# Altium footprint library Resistors.PcbLib: 63 footprints (part 1 of 4)
Each footprint in its own frame and in the unit in brackets; x right, y up, seen from the top. Pads: shape width x height; smd on the part's side, far side on the other; paste and mask are expansions set on the pad; w line width, h text height; cw(c..) or ccw(c..) is an arc to the next point about the centre after c.
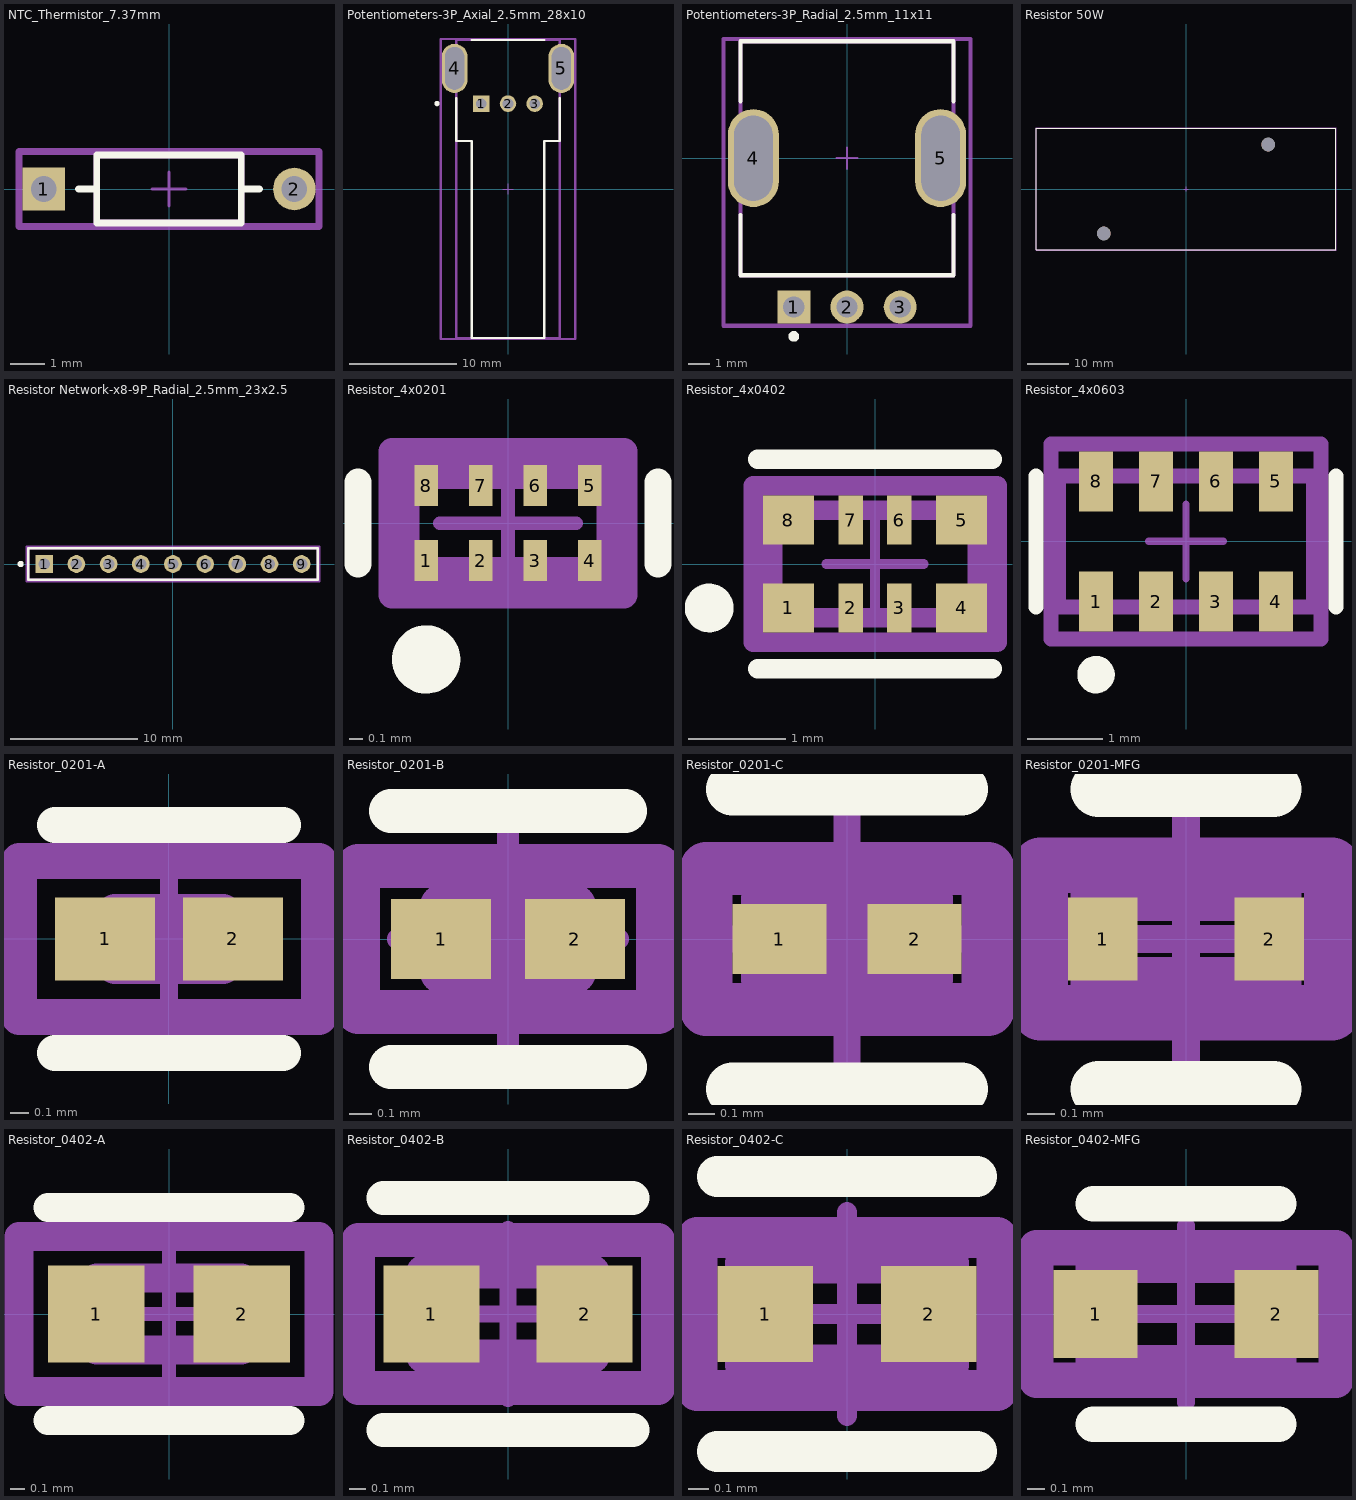
[diagram p0: the footprints below, top view; thin cyan lines are the x and y axes]

## NTC_Thermistor_7.37mm [mm]
pads (2):
  rect 1.25x1.25 hole 0.75 paste-2539.97 mask+0: 1(-3.685,0)
  round 1.25 hole 0.75 paste-2539.97 mask+0: 2(3.685,0)
Top Overlay:
  lines w0.2: -2.66,0 -2.125,0 ; 2.125,0 2.66,0 ; -2.125,-1 2.125,-1 2.125,1 -2.125,1 -2.125,-1
Top Assembly:
  lines w0.2: -4.41,-1.1 4.41,-1.1 4.41,1.1 -4.41,1.1 -4.41,-1.1
Top 3D Body:
  lines w0.2: -2.125,-1 2.125,-1 2.125,1 -2.125,1 -2.125,-1
Top Courtyard:
  lines w0.2: -4.41,-1.1 4.41,-1.1 4.41,1.1 -4.41,1.1 -4.41,-1.1
Top Component Center:
  lines w0.1: -0.5,0 0.5,0 ; 0,-0.5 0,0.5
3D body "Res_Vishay_BC_Components_NTCLG100E2224JB_eec.STEP": height 0.25, standoff 0, extent -4.41,-1.1 4.41,1.1

## Potentiometers-3P_Axial_2.5mm_28x10 [mm]
pads (5):
  rect 1.55x1.55 hole 1 paste-2539.97 mask+0: 1(-2.5,8)
  round 1.55 hole 1 paste-2539.97 mask+0: 2(0,8) 3(2.5,8)
  rrect100% 2.4x4.6 hole 4 slot 1.8 at 0 deg paste-2539.97 mask+0: 4(-5,11.3) 5(5,11.3)
Top Overlay:
  circle w0.25: c-6.65,8 r0.125
  lines w0.2: -4.85,8.5 -4.85,4.5 -3.4,4.5 -3.4,-13.95 3.4,-13.95 3.4,4.5 4.85,4.5 4.85,8.5 ; -3.425,13.95 3.425,13.95
Top Assembly:
  lines w0.2: -6.3,-14.05 -6.3,14.05 6.3,14.05 6.3,-14.05 -6.3,-14.05
Top 3D Body:
  lines w0.2: -4.85,-13.95 -4.85,13.95 4.85,13.95 4.85,-13.95 -4.85,-13.95
Top Courtyard:
  lines w0.2: -6.3,-14.05 -6.3,14.05 6.3,14.05 6.3,-14.05 -6.3,-14.05
Top Component Center:
  lines w0.1: -0.5,0 0.5,0 ; 0,-0.5 0,0.5
3D body "Res_Bourns_PTV09A-8025U-B103_eec.STEP": height 0.25, standoff 0, extent -6.3,-14.05 6.3,14.05

## Potentiometers-3P_Radial_2.5mm_11x11 [mm]
pads (5):
  rect 1.55x1.55 hole 1 paste-2539.97 mask+0: 1(-2.5,-7)
  round 1.55 hole 1 paste-2539.97 mask+0: 2(0,-7) 3(2.5,-7)
  rrect100% 2.4x4.6 hole 4 slot 1.8 at 0 deg paste-2539.97 mask+0: 4(-4.4,0) 5(4.4,0)
Top Overlay:
  circle w0.25: c-2.5,-8.375 r0.125
  lines w0.2: -5,-2.675 -5,-5.5 5,-5.5 5,-2.675 ; -5,2.675 -5,5.5 5,5.5 5,2.675
Top Assembly:
  lines w0.2: -5.8,-7.875 -5.8,5.6 5.8,5.6 5.8,-7.875 -5.8,-7.875
Top 3D Body:
  lines w0.2: -5,-5.5 -5,5.5 5,5.5 5,-5.5 -5,-5.5
Top Courtyard:
  lines w0.2: -5.8,-7.875 -5.8,5.6 5.8,5.6 5.8,-7.875 -5.8,-7.875
Top Component Center:
  lines w0.1: -0.5,0 0.5,0 ; 0,-0.5 0,0.5
3D body "Res_Bourns_Inc_PTV09A-4020F-A203_eec.STEP": height 0.25, standoff 0, extent -5.8,-7.875 5.8,5.6

## Resistor 50W [mm]
pads (2):
  round 3.307 hole 3.307 unplated paste-2539.97 mask+0: ""(-19.835,-10.72) ""(19.835,10.72)
Top Overlay:
  lines w0.2: -36.105,-14.67 36.105,-14.67 36.105,14.67 -36.105,14.67 -36.105,-14.67
Top Assembly:
  lines w0.2: -36.205,-14.77 36.205,-14.77 36.205,14.77 -36.205,14.77 -36.205,-14.77
Top 3D Body:
  lines w0.2: -36.105,-14.67 36.105,-14.67 36.105,14.67 -36.105,14.67 -36.105,-14.67
Top Courtyard:
  lines w0.2: -36.205,-14.77 36.205,-14.77 36.205,14.77 -36.205,14.77 -36.205,-14.77
Top Component Center:
  lines w0.1: -0.5,0 0.5,0 ; 0,-0.5 0,0.5
3D body "Res_vishay_RH05020R00FE02_eec.STEP": height 0.25, standoff 0, extent -36.205,-14.77 36.205,14.77

## Resistor Network-x8-9P_Radial_2.5mm_23x2.5 [mm]
pads (9):
  rect 1.4x1.4 hole 0.9 paste-2539.97 mask+0: 1(-10.16,0)
  round 1.4 hole 0.9 paste-2539.97 mask+0: 2(-7.62,0) 3(-5.08,0) 4(-2.54,0) 5(0,0) 6(2.54,0) 7(5.08,0) 8(7.62,0) 9(10.16,0)
Top Overlay:
  circle w0.25: c-12.03,0 r0.125
  lines w0.2: -11.43,-1.25 11.43,-1.25 11.43,1.25 -11.43,1.25 -11.43,-1.25
Top Assembly:
  lines w0.2: -11.53,-1.35 11.53,-1.35 11.53,1.35 -11.53,1.35 -11.53,-1.35
Top 3D Body:
  lines w0.2: -11.43,-1.25 11.43,-1.25 11.43,1.25 -11.43,1.25 -11.43,-1.25
Top Courtyard:
  lines w0.2: -11.53,-1.35 11.53,-1.35 11.53,1.35 -11.53,1.35 -11.53,-1.35
Top Component Center:
  lines w0.1: -0.5,0 0.5,0 ; 0,-0.5 0,0.5
3D body "Res_International_Resistive_L091S222LF_eec.STEP": height 0.25, standoff 0, extent -11.53,-1.35 11.53,1.35

## Resistor_4x0201 [mm]
pads (8):
  rect 0.175x0.3 smd paste+0 mask+0: 1(-0.6,-0.275) 2(-0.2,-0.275) 3(0.2,-0.275) 4(0.6,-0.275) 5(0.6,0.275) 6(0.2,0.275) 7(-0.2,0.275) 8(-0.6,0.275)
Top Overlay:
  circle w0.25: c-0.6,-1 r0.125
  lines w0.2: -1.1,-0.3 -1.1,0.3 ; 1.1,-0.3 1.1,0.3
Top Assembly:
  lines w0.2: -0.85,-0.525 0.85,-0.525 0.85,0.525 -0.85,0.525 -0.85,-0.525
Top 3D Body:
  lines w0.2: -0.75,-0.35 0.75,-0.35 0.75,0.35 -0.75,0.35 -0.75,-0.35
Top Courtyard:
  lines w0.2: -0.85,-0.525 0.85,-0.525 0.85,0.525 -0.85,0.525 -0.85,-0.525
Top Component Center:
  lines w0.1: -0.5,0 0.5,0 ; 0,-0.5 0,0.5
3D body "Res_Panasonic_EXB-18V472JX_eec.STEP": height 0.25, standoff 0, extent -0.85,-0.525 0.85,0.525

## Resistor_4x0402 [mm]
pads (8):
  rect 0.525x0.5 smd paste+0 mask+0: 1(-0.887,-0.45) 4(0.887,-0.45) 5(0.887,0.45) 8(-0.887,0.45)
  rect 0.25x0.5 smd paste+0 mask+0: 2(-0.25,-0.45) 3(0.25,-0.45) 6(0.25,0.45) 7(-0.25,0.45)
Top Overlay:
  circle w0.25: c-1.7,-0.45 r0.125
  lines w0.2: -1.2,-1.075 1.2,-1.075 ; -1.2,1.075 1.2,1.075
Top Assembly:
  lines w0.2: -1.25,-0.8 1.25,-0.8 1.25,0.8 -1.25,0.8 -1.25,-0.8
Top 3D Body:
  lines w0.2: -1.05,-0.55 1.05,-0.55 1.05,0.55 -1.05,0.55 -1.05,-0.55
Top Courtyard:
  lines w0.2: -1.25,-0.8 1.25,-0.8 1.25,0.8 -1.25,0.8 -1.25,-0.8
Top Component Center:
  lines w0.1: -0.5,0 0.5,0 ; 0,-0.5 0,0.5
3D body "Res_Panasonic_EXB-28V103JX_eec.STEP": height 0.25, standoff 0, extent -1.25,-0.8 1.25,0.8

## Resistor_4x0603 [mm]
pads (8):
  rect 0.45x0.8 smd paste+0 mask+0: 1(-1.2,-0.8) 2(-0.4,-0.8) 3(0.4,-0.8) 4(1.2,-0.8) 5(1.2,0.8) 6(0.4,0.8) 7(-0.4,0.8) 8(-1.2,0.8)
Top Overlay:
  circle w0.25: c-1.2,-1.775 r0.125
  lines w0.2: -2,-0.875 -2,0.875 ; 2,-0.875 2,0.875
Top Assembly:
  lines w0.2: -1.8,-1.3 1.8,-1.3 1.8,1.3 -1.8,1.3 -1.8,-1.3
Top 3D Body:
  lines w0.2: -1.7,-0.875 1.7,-0.875 1.7,0.875 -1.7,0.875 -1.7,-0.875
Top Courtyard:
  lines w0.2: -1.8,-1.3 1.8,-1.3 1.8,1.3 -1.8,1.3 -1.8,-1.3
Top Component Center:
  lines w0.1: -0.5,0 0.5,0 ; 0,-0.5 0,0.5
3D body "Res_Panasonic_EXB-38V103JV_eec.STEP": height 0.25, standoff 0, extent -1.8,-1.3 1.8,1.3

## Resistor_0201-A [mm]
pads (2):
  rect 0.554x0.463 smd paste+0 mask+0: 1(-0.354,0) 2(0.354,0)
Top Overlay:
  lines w0.2: -0.631,-0.631 0.631,-0.631 ; -0.631,0.631 0.631,0.631
Top Assembly:
  lines w0.2: -0.831,-0.431 0.831,-0.431 0.831,0.431 -0.831,0.431 -0.831,-0.431
Top 3D Body:
  lines w0.2: -0.3,-0.15 0.3,-0.15 0.3,0.15 -0.3,0.15 -0.3,-0.15
Top Courtyard:
  lines w0.2: -0.831,-0.431 0.831,-0.431 0.831,0.431 -0.831,0.431 -0.831,-0.431
Top Component Center:
  lines w0.1: -0.5,0 0.5,0 -0.5,0 ; 0,-0.5 0,0.5 0,-0.5
3D body "Res_Panasonic_Electronic_Components_ERJ-1GNF4872C_eec.STEP": height 0.25, standoff 0, extent -0.831,-0.431 0.831,0.431

## Resistor_0201-B [mm]
pads (2):
  rect 0.454x0.363 smd paste+0 mask+0: 1(-0.304,0) 2(0.304,0)
Top Overlay:
  lines w0.2: -0.531,-0.581 0.531,-0.581 ; -0.531,0.581 0.531,0.581
Top Assembly:
  lines w0.2: -0.681,-0.331 0.681,-0.331 0.681,0.331 -0.681,0.331 -0.681,-0.331
Top 3D Body:
  lines w0.2: -0.3,-0.15 0.3,-0.15 0.3,0.15 -0.3,0.15 -0.3,-0.15
Top Courtyard:
  lines w0.2: -0.681,-0.331 0.681,-0.331 0.681,0.331 -0.681,0.331 -0.681,-0.331
Top Component Center:
  lines w0.1: -0.5,0 0.5,0 -0.5,0 ; 0,-0.5 0,0.5 0,-0.5
3D body "Res_Panasonic_Electronic_Components_ERJ-1GNF4872C_eec.STEP": height 0.25, standoff 0, extent -0.681,-0.331 0.681,0.331

## Resistor_0201-C [mm]
pads (2):
  rect 0.354x0.263 smd paste+0 mask+0: 1(-0.254,0) 2(0.254,0)
Top Overlay:
  lines w0.2: -0.431,-0.565 0.431,-0.565 ; -0.431,0.565 0.431,0.565
Top Assembly:
  lines w0.2: -0.531,-0.265 -0.531,0.265 0.531,0.265 0.531,-0.265 -0.531,-0.265
Top 3D Body:
  lines w0.2: -0.3,-0.15 -0.3,0.15 0.3,0.15 0.3,-0.15 -0.3,-0.15
Top Courtyard:
  lines w0.2: -0.531,-0.265 -0.531,0.265 0.531,0.265 0.531,-0.265 -0.531,-0.265
Top Component Center:
  lines w0.1: -0.5,0 0.5,0 -0.5,0 ; 0,-0.5 0,0.5 0,-0.5
3D body "Res_Panasonic_Electronic_Components_ERJ-1GNF4872C_eec.STEP": height 0.25, standoff 0, extent -0.531,-0.265 0.531,0.265

## Resistor_0201-MFG [mm]
pads (2):
  rect 0.25x0.3 smd paste+0 mask+0: 1(-0.3,0) 2(0.3,0)
Top Overlay:
  lines w0.2: -0.315,-0.54 0.315,-0.54 ; -0.315,0.54 0.315,0.54
Top Assembly:
  lines w0.2: -0.525,-0.265 -0.525,0.265 0.525,0.265 0.525,-0.265 -0.525,-0.265
Top 3D Body:
  lines w0.2: -0.315,-0.165 -0.315,0.165 0.315,0.165 0.315,-0.165 -0.315,-0.165
Top Courtyard:
  lines w0.2: -0.525,-0.265 -0.525,0.265 0.525,0.265 0.525,-0.265 -0.525,-0.265
Top Component Center:
  lines w0.1: -0.5,0 0.5,0 ; 0,-0.5 0,0.5
3D body "Res_Panasonic_Electronic_Components_ERJ-1GNF4872C_eec.STEP": height 0.25, standoff 0, extent -0.525,-0.265 0.525,0.265

## Resistor_0402-A [mm]
pads (2):
  rect 0.668x0.672 smd paste+0 mask+0: 1(-0.502,0) 2(0.502,0)
Top Overlay:
  lines w0.2: -0.836,-0.736 0.836,-0.736 ; -0.836,0.736 0.836,0.736
Top Assembly:
  lines w0.2: -1.036,-0.536 1.036,-0.536 1.036,0.536 -1.036,0.536 -1.036,-0.536
Top 3D Body:
  lines w0.2: -0.5,-0.25 0.5,-0.25 0.5,0.25 -0.5,0.25 -0.5,-0.25
Top Courtyard:
  lines w0.2: -1.036,-0.536 1.036,-0.536 1.036,0.536 -1.036,0.536 -1.036,-0.536
Top Component Center:
  lines w0.1: -0.5,0 0.5,0 ; 0,-0.5 0,0.5
3D body "Res_Panasonic_ERJ-2RKF10R0X_eec.STEP": height 0.25, standoff 0, extent -1.036,-0.536 1.036,0.536

## Resistor_0402-B [mm]
pads (2):
  rect 0.568x0.572 smd paste+0 mask+0: 1(-0.452,0) 2(0.452,0)
Top Overlay:
  lines w0.2: -0.736,-0.686 0.736,-0.686 ; -0.736,0.686 0.736,0.686
Top Assembly:
  lines w0.2: -0.886,-0.436 -0.886,0.436 0.886,0.436 0.886,-0.436 -0.886,-0.436
Top 3D Body:
  lines w0.2: -0.5,-0.25 -0.5,0.25 0.5,0.25 0.5,-0.25 -0.5,-0.25
Top Courtyard:
  lines w0.2: -0.886,-0.436 -0.886,0.436 0.886,0.436 0.886,-0.436 -0.886,-0.436
Top Component Center:
  lines w0.1: -0.5,0 0.5,0 ; 0,-0.5 0,0.5
3D body "Res_Panasonic_ERJ-2RKF10R0X_eec.STEP": height 0.25, standoff 0, extent -0.886,-0.436 0.886,0.436

## Resistor_0402-C [mm]
pads (2):
  rect 0.468x0.472 smd paste+0 mask+0: 1(-0.402,0) 2(0.402,0)
Top Overlay:
  lines w0.2: -0.636,-0.675 0.636,-0.675 ; -0.636,0.675 0.636,0.675
Top Assembly:
  lines w0.2: -0.736,-0.375 -0.736,0.375 0.736,0.375 0.736,-0.375 -0.736,-0.375
Top 3D Body:
  lines w0.2: -0.5,-0.25 -0.5,0.25 0.5,0.25 0.5,-0.25 -0.5,-0.25
Top Courtyard:
  lines w0.2: -0.736,-0.375 -0.736,0.375 0.736,0.375 0.736,-0.375 -0.736,-0.375
Top Component Center:
  lines w0.1: -0.5,0 0.5,0 ; 0,-0.5 0,0.5
3D body "Res_Panasonic_ERJ-2RKF10R0X_eec.STEP": height 0.25, standoff 0, extent -0.736,-0.375 0.736,0.375

## Resistor_0402-MFG [mm]
pads (2):
  rect 0.475x0.5 smd paste+0 mask+0: 1(-0.513,0) 2(0.513,0)
Top Overlay:
  lines w0.2: -0.525,-0.625 0.525,-0.625 ; -0.525,0.625 0.525,0.625
Top Assembly:
  lines w0.2: -0.85,-0.375 0.85,-0.375 0.85,0.375 -0.85,0.375 -0.85,-0.375
Top 3D Body:
  lines w0.2: -0.525,-0.275 0.525,-0.275 0.525,0.275 -0.525,0.275 -0.525,-0.275
Top Courtyard:
  lines w0.2: -0.85,-0.375 0.85,-0.375 0.85,0.375 -0.85,0.375 -0.85,-0.375
Top Component Center:
  lines w0.1: -0.5,0 0.5,0 ; 0,-0.5 0,0.5
3D body "Res_Panasonic_ERJ-2RKF10R0X_eec.STEP": height 0.25, standoff 0, extent -0.85,-0.375 0.85,0.375